# Altium footprint library General.PcbLib: 446 footprints (part 17 of 28)
Each footprint in its own frame and in the unit in brackets; x right, y up, seen from the top. Pads: shape width x height; smd on the part's side, far side on the other; paste and mask are expansions set on the pad; w line width, h text height; cw(c..) or ccw(c..) is an arc to the next point about the centre after c.
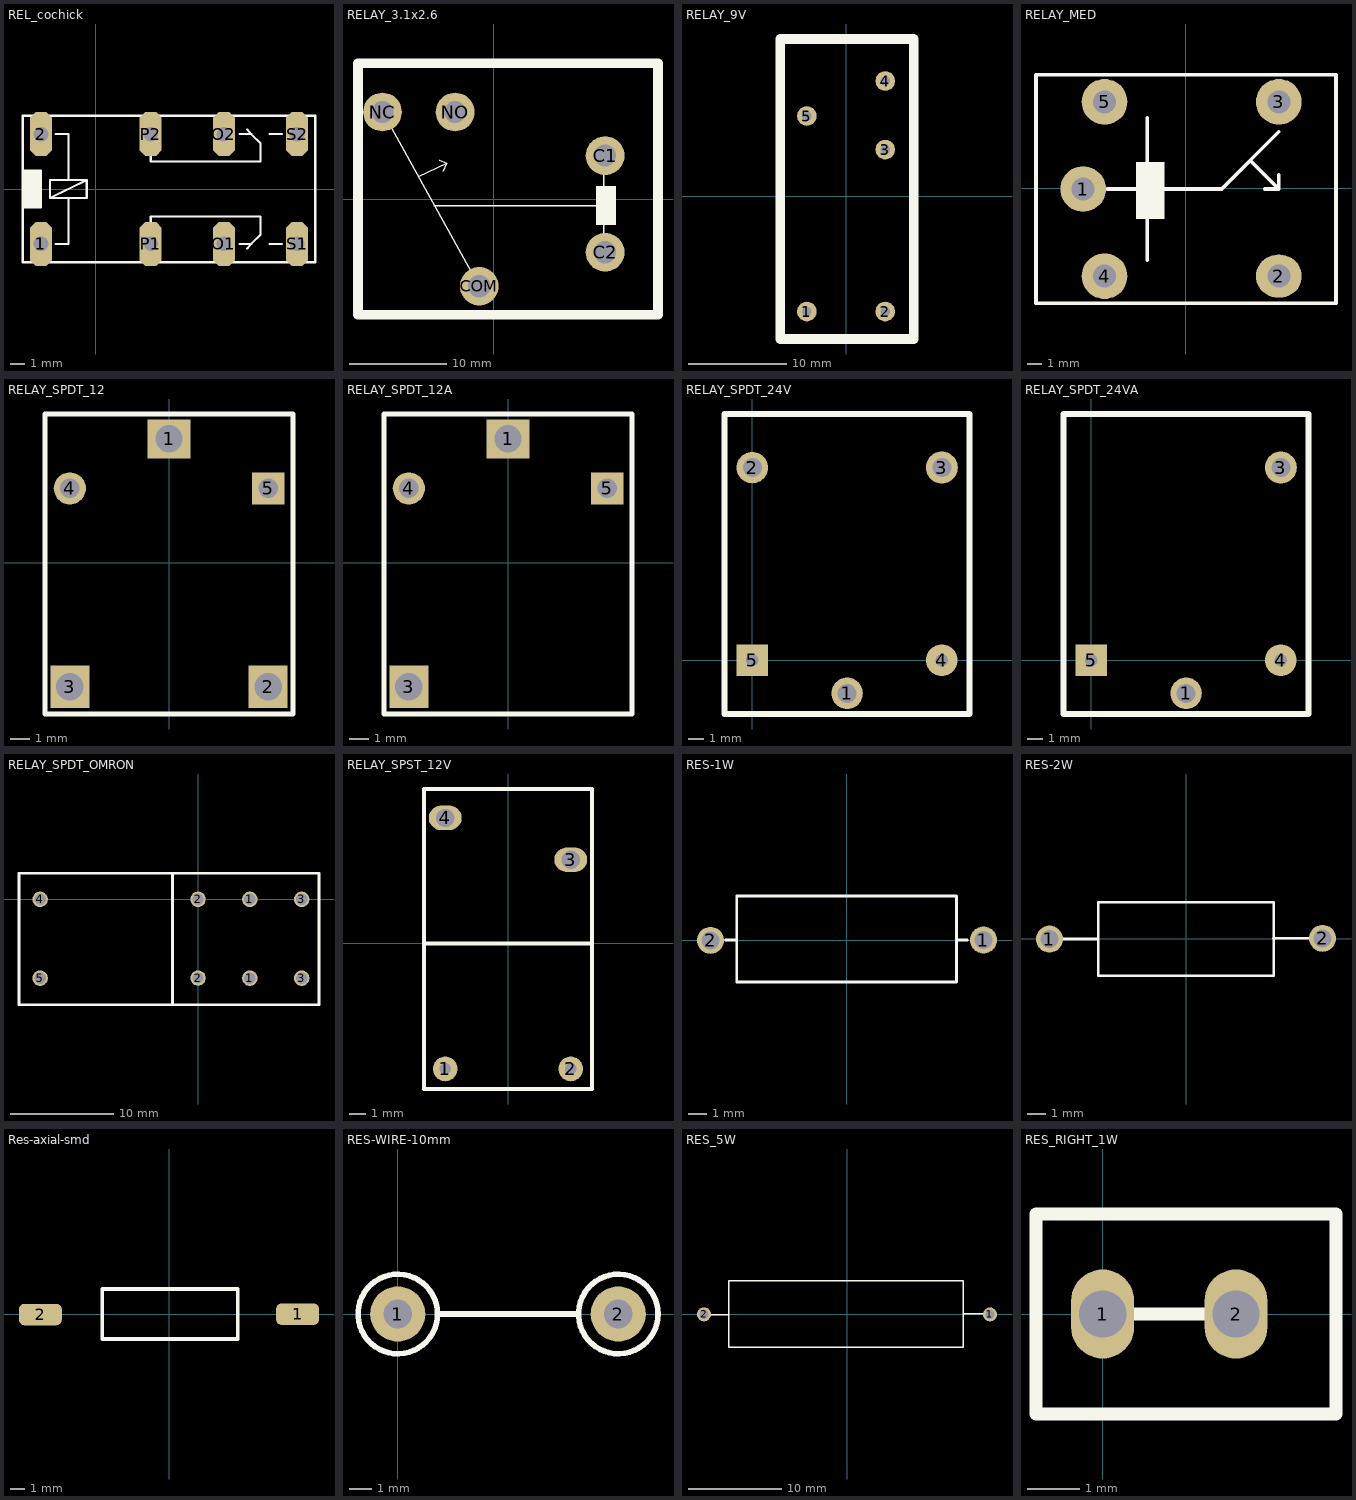
[diagram p16: the footprints below, top view; thin cyan lines are the x and y axes]

## REL_cochick [mil]
pads (8):
  oct 60x120 hole 40: 1(-150,-150) 2(-150,150) O1(350,-150) O2(350,150) P1(150,-150) P2(150,150) S1(550,-150) S2(550,150)
Top Overlay:
  rectangle: -200,-50 -150,50
  lines w6: -110,-150 -75,-150 -75,-25 ; -110,150 -75,150 -75,25 ; 150,-110 150,-75 450,-75 450,-125 425,-150 ; 150,110 150,75 450,75 450,125 425,150 ; 393,-150 425,-150 ; 393,150 425,150 ; 413,-163 425,-150 ; 413,163 425,150 ; 475,-150 508,-150 ; 475,150 508,150 ; -200,-50 -200,-200 600,-200 600,200 -200,200 -200,50 ; -200,-50 -150,-50 -150,50 -200,50 ; -200,-50 -200,50 ; -125,-25 -25,25 ; -125,-25 -75,-25 ; -125,-25 -125,25 -75,25 ; -75,-25 -25,-25 -25,25 ; -75,25 -25,25
3D body "relay.step": height 452.76, standoff -118.11, extent -205,-202.63 602.09,195

## RELAY_3.1x2.6 [mm]
pads (5):
  round 4 hole 2.3: C1(11.5,4.5) C2(11.5,-5.5) COM(-1.5,-9) NC(-11.5,9) NO(-4,9)
Top Overlay:
  rectangle: 10.562,-2.684 12.604,1.336
  lines w0.15: -11.645,9.301 -1.5,-9 ; -7.798,2.305 -4.883,3.704 ; -6.186,-0.674 11.47,-0.674 ; -5.641,3.996 -4.883,3.704 ; 11.382,-5.682 11.382,4.5 11.5,4.5 ; -4.883,3.704 -5.232,2.888 -4.883,3.704
  lines w1: -14.031,-11.954 16.969,-11.954 16.969,14.046 -14.031,14.046 -14.031,-11.954
3D body: height 28, standoff 0.3, extent -13.438,-11.384 16.534,13.508

## RELAY_9V [mm]
pads (5):
  round 2 hole 1: 1(-4,-11.757) 2(3.999,-11.757) 3(4,4.758) 4(4,11.758) 5(-4,8.187)
Top Overlay:
  lines w1: -6.7,-14.558 6.9,-14.558 6.9,16.043 -6.7,16.043 -6.7,-14.558
3D body: height 20, standoff 0, extent -6.2,-14.1 6.4,15.5

## RELAY_MED [mm]
pads (5):
  round 3.2 hole 1.6: 1(-7.189,-0.041) 3(6.511,6.059) 4(-5.689,-6.141) 5(-5.689,6.059)
  oval 3.2x3 hole 1.6: 2(6.511,-6.141)
Top Overlay:
  region: -1.489,1.859 -3.489,1.859 -3.489,-2.141 -1.489,-2.141
  lines w0.254: -5.489,-0.041 2.511,-0.041 6.511,3.959 ; -2.689,-5.041 -2.689,4.959 ; 4.511,1.959 6.511,-0.041 ; 5.511,-0.041 6.511,-0.041 ; 6.511,0.959 6.511,-0.041 ; 6.511,3.959 6.511,3.959 ; -10.489,-8.041 -10.489,7.959 10.511,7.959 10.511,-8.041 -10.489,-8.041
3D body "User Library-SONGLE Relay SRU-12VDC-SL-C.STEP": height 15.3, standoff -5, extent -9,-7.5 10.1,8

## RELAY_SPDT_12 [mm]
pads (5):
  rect 2.2x2 hole 1.4: 1(0,6.35)
  rect 2x2.2 hole 1.4: 2(5.08,-6.35) 3(-5.08,-6.35)
  round 1.65 hole 1: 4(-5.08,3.81)
  rect 1.65x1.65 hole 1: 5(5.08,3.81)
Top Overlay:
  lines w0.254: -6.35,-7.747 -6.35,7.62 6.35,7.62 6.35,-7.747 -6.35,-7.747
3D body: height 2.08, standoff -3, extent 4.839,3.391 5.321,4.229
3D body: height 2.08, standoff -3, extent -5.321,3.391 -4.839,4.229
3D body: height 2.08, standoff -3, extent 4.445,-6.604 5.715,-6.071
3D body: height 2.08, standoff -3, extent -5.715,-6.604 -4.445,-6.071
3D body: height 2.08, standoff -3, extent -0.635,6.071 0.635,6.604
3D body: height 12.7, standoff 0, extent -6.324,-7.696 6.325,7.569

## RELAY_SPDT_12A [mm]
pads (4):
  rect 2.2x2 hole 1.4: 1(0,6.35)
  rect 2x2.2 hole 1.4: 3(-5.08,-6.35)
  round 1.65 hole 1: 4(-5.08,3.81)
  rect 1.65x1.65 hole 1: 5(5.08,3.81)
Top Overlay:
  lines w0.254: -6.35,-7.747 6.35,-7.747 6.35,7.62 -6.35,7.62 -6.35,-7.747
3D body: height 12.7, standoff 0, extent -6.324,-7.696 6.325,7.569
3D body: height 2.08, standoff -3, extent -0.635,6.071 0.635,6.604
3D body: height 2.08, standoff -3, extent -5.715,-6.604 -4.445,-6.071
3D body: height 2.08, standoff -3, extent -5.321,3.391 -4.839,4.229
3D body: height 2.08, standoff -3, extent 4.839,3.391 5.321,4.229

## RELAY_SPDT_24V [mm] "HKE"
pads (5):
  round 2 hole 1.2: 1(6,-2.1) 2(0,12.2)
  round 2.032 hole 1.2: 3(12,12.2)
  round 2 hole 0.8: 4(12,0)
  rect 2x2 hole 0.8: 5(0,0)
Top Overlay:
  lines w0.381: -1.756,-3.408 -1.756,15.592 13.744,15.592 13.744,-3.408 -1.756,-3.408
3D body "Tianbo Relay ( HJR-3FF-S-Z).step": height 15.51, standoff -2.2, extent -1.756,-3.408 13.744,15.592

## RELAY_SPDT_24VA [mm] "HKE"
pads (4):
  round 2 hole 1.2: 1(6,-2.1)
  round 2.032 hole 1.2: 3(12,12.2)
  round 2 hole 0.8: 4(12,0)
  rect 2x2 hole 0.8: 5(0,0)
Top Overlay:
  lines w0.381: -1.756,-3.408 -1.756,15.592 13.744,15.592 13.744,-3.408 -1.756,-3.408
3D body "Tianbo Relay ( HJR-3FF-S-Z).step": height 15.51, standoff -2.2, extent -1.756,-3.408 13.744,15.592

## RELAY_SPDT_OMRON [mm] "6 bin book"
pads (8):
  round 1.5 hole 1.1: 1(5,-7.61) 1(5,-0.01) 2(0,-7.6) 2(0,0) 3(10,-7.61) 3(10,-0.01) 4(-15.249,-0.01) 5(-15.249,-7.61)
Top Overlay:
  lines w0.254: -2.74,-10.183 -2.461,-10.183 -2.461,2.517 ; -17.281,-10.183 -17.281,2.517 11.675,2.517 11.675,-10.183 -17.281,-10.183
3D body "OMRON G2R-2 RELAY.STEP": height 25.96, standoff -4.01, extent -17.281,-10.208 11.675,2.517

## RELAY_SPST_12V [mm] "mini-10x18x14.5"
pads (4):
  round 1.5 hole 0.7: 1(-3.81,-7.62) 2(3.81,-7.62)
  oval 2x1.5 hole 1.1: 3(3.81,5.08) 4(-3.81,7.62)
Top Overlay:
  lines w0.254: -5.105,0 5.105,0 ; -5.105,-8.839 -5.105,9.373 5.105,9.373 5.105,-8.839 -5.105,-8.839
3D body "SPST-T77.stp": height 14.6, standoff -4.1, extent -5.1,-8.821 5.1,9.38

## RES-1W [mm]
pads (2):
  round 1.5 hole 1: 1(7.58,0.009) 2(-7.58,-0.009)
Top Overlay:
  lines w0.15: -6.751,0.009 -6.12,0.009 ; 6.08,0.009 6.68,0.009 ; -6.12,-2.326 6.08,-2.326 6.08,2.455 -6.12,2.455 -6.12,-2.326
3D body "User Library-RES-1W.STEP": height 5, standoff -3, extent -7.99,-2.491 7.95,2.509

## RES-2W [mm]
pads (2):
  round 1.5 hole 1: 1(-7.594,-0.02) 2(7.594,0.02)
Top Overlay:
  lines w0.15: -7.594,-0.02 -4.923,-0.02 ; 4.86,0.027 7.594,0.02 ; -4.886,-2.069 -4.886,2.035 4.876,2.035 4.876,-2.069 -4.886,-2.069
3D body "User Library-Resistor_Carvao_2W.STEP": height 4.2, standoff -3.8, extent -8.041,-2.009 7.999,1.991

## Res-axial-smd [mm]
pads (2):
  rrect50% 3x1.5 smd: 1(9,0.013) 2(-9,-0.013)
Top Overlay:
  lines w0.254: -4.674,-1.727 -4.674,1.778 4.801,1.778 4.801,-1.727 -4.674,-1.727
3D body "Res50-Axial 0_5W-560R.step": height 4.38, standoff -5, extent -6.649,-1.875 6.801,1.875

## RES-WIRE-10mm [mm]
pads (2):
  round 2.5 hole 1.3: 1(0,0) 2(10,0)
Top Overlay:
  circle w0.254: c0,0 r1.803
  circle w0.254: c10,0 r1.803
  lines w0.254: 1.803,0 8.204,0

## RES_5W [mm]
pads (2):
  round 1.5 hole 1: 1(15.275,-0.004) 2(-15.275,0.004)
Top Overlay:
  lines w0.15: -15.275,0.004 -15.275,-0.027 -12.644,-0.027 ; 12.395,-3.519 -12.653,-3.519 -12.653,3.599 12.395,3.599 12.395,-3.512 ; 12.424,0.045 15.275,0.045 15.275,-0.004
3D body "SW3dPS-5w wid.STEP": height 7.95, standoff -3.25, extent -15.627,-3.474 15.653,3.526

## RES_RIGHT_1W [mm]
pads (2):
  oval 1.2x1.7 hole 0.9: 1(0,0) 2(2.54,0)
Top Overlay:
  lines w0.254: 0,0 2.54,0 ; -1.27,-1.905 -1.27,1.905 4.445,1.905 4.445,-1.905 -1.27,-1.905
3D body "1W right 100mil.step": height 14.83, standoff -2.23, extent -0.301,-1.9 4.44,1.9